# Altium footprint library bitfury.PcbLib: 41 footprints (part 3 of 3)
Each footprint in its own frame and in the unit in brackets; x right, y up, seen from the top. Pads: shape width x height; smd on the part's side, far side on the other; paste and mask are expansions set on the pad; w line width, h text height; cw(c..) or ccw(c..) is an arc to the next point about the centre after c.
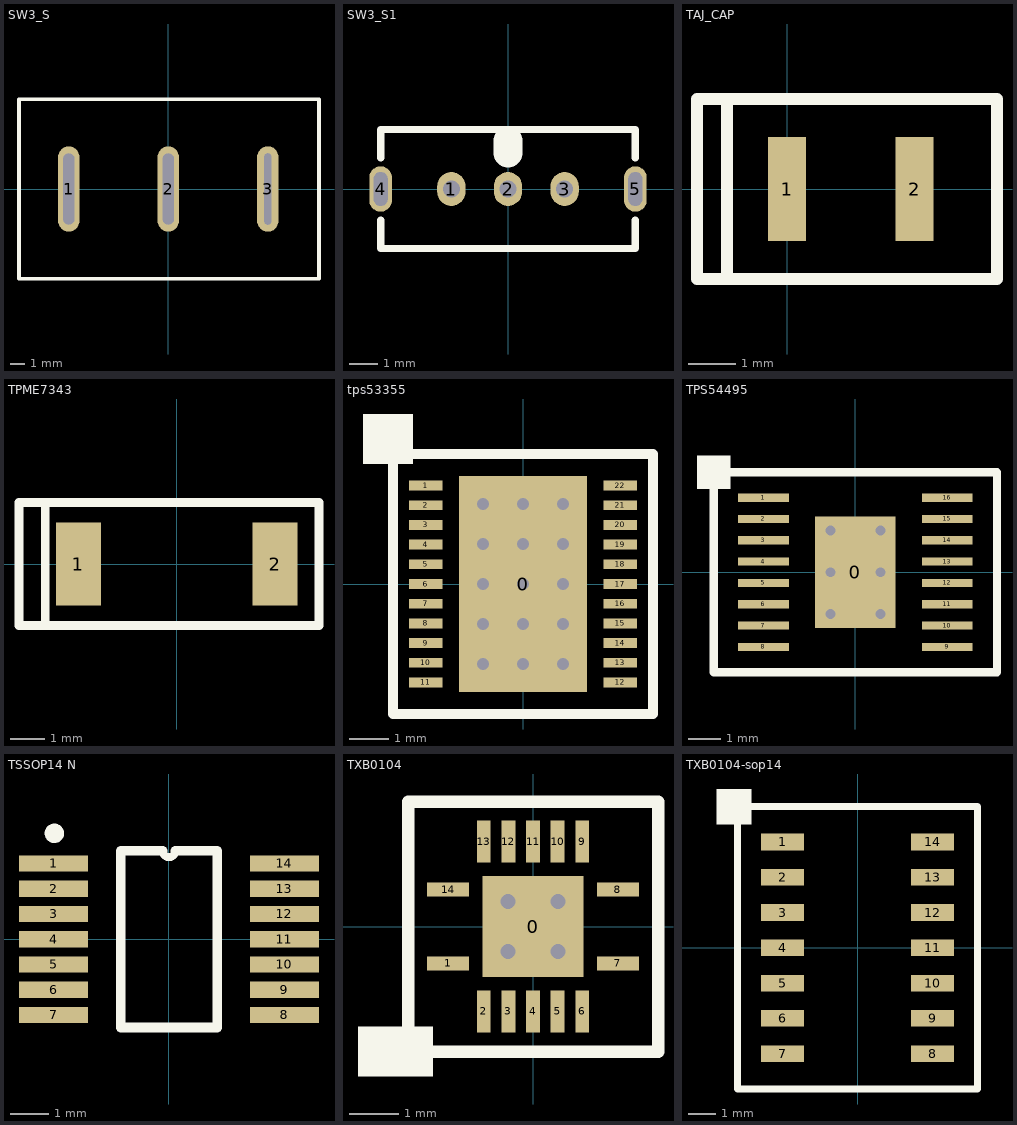
[diagram p2: the footprints below, top view; thin cyan lines are the x and y axes]

## SW3_S [mm]
pads (3):
  oval 1.5x6 hole 0.8 slot 5 at 90 deg: 1(-7,0) 2(0,0)
  oval 1.5x6 hole 0.5 slot 5 at 90 deg: 3(7,0)
Top Overlay:
  lines w0.254: -10.5,-6.3 10.6,-6.3 10.6,6.3 -10.5,6.3 -10.5,-6.3
3D body: height 13.8, standoff 0.1, extent -10.706,-6.5 10.8,6.5

## SW3_S1 [mm]
pads (5):
  oval 1x1.2 hole 0.6: 1(-2,0) 2(0,0) 3(2,0)
  oval 0.8x1.6 hole 0.5 slot 1.2 at 90 deg: 4(-4.5,0) 5(4.5,0)
Top Overlay:
  lines w0.254: -4.496,-1.092 -4.496,-2.1 4.496,-2.1 4.496,-1.092 ; -4.496,1.092 -4.496,2.1 4.496,2.1 4.496,1.092
  lines w1.016: 0,1.27 0,1.702

## TAJ_CAP [mm]
pads (2):
  rect 0.8x2.2 smd: 1(0,0) 2(2.7,0)
Top Overlay:
  lines w0.254: -1.27,-1.905 -1.27,1.905 -1.905,1.905 ; -1.905,1.905 4.445,1.905 4.445,-1.905 -1.905,-1.905 -1.905,1.905

## TPME7343 [mm]
pads (2):
  rect 1.3x2.4 smd: 1(-2.85,0) 2(2.85,0)
Top Overlay:
  lines w0.254: -3.81,-1.778 -3.81,1.778 -4.12,1.778 ; -4.12,1.778 4.12,1.778 4.12,-1.778 -4.572,-1.778 -4.572,1.778 -4.12,1.778

## tps53355 [mm]
pads (23):
  rect 3.24x5.48 smd: 0(0,0)
  rect 0.85x0.25 smd: 1(-2.475,2.5) 2(-2.475,2) 3(-2.475,1.5) 4(-2.475,1) 5(-2.475,0.5) 6(-2.475,0) 7(-2.475,-0.5) 8(-2.475,-1) 9(-2.475,-1.5) 10(-2.475,-2) 11(-2.475,-2.5) 12(2.475,-2.5) 13(2.475,-2) 14(2.475,-1.5) 15(2.475,-1) 16(2.475,-0.5) 17(2.475,0) 18(2.475,0.5) 19(2.475,1) 20(2.475,1.5) 21(2.475,2) 22(2.475,2.5)
via -1.016,2.032 diameter 0.6 hole 0.3
via 0,2.032 diameter 0.6 hole 0.3
via 1.016,2.032 diameter 0.6 hole 0.3
via -1.016,1.016 diameter 0.6 hole 0.3
via 0,1.016 diameter 0.6 hole 0.3
via 1.016,1.016 diameter 0.6 hole 0.3
via -1.016,0 diameter 0.6 hole 0.3
via 0,0 diameter 0.6 hole 0.3
via 1.016,0 diameter 0.6 hole 0.3
via -1.016,-1.016 diameter 0.6 hole 0.3
via 0,-1.016 diameter 0.6 hole 0.3
via 1.016,-1.016 diameter 0.6 hole 0.3
via -1.016,-2.032 diameter 0.6 hole 0.3
via 0,-2.032 diameter 0.6 hole 0.3
via 1.016,-2.032 diameter 0.6 hole 0.3
Top Overlay:
  rectangle: -4.064,3.048 -2.794,4.318
  lines w0.254: -3.302,-3.302 3.302,-3.302 3.302,3.302 -3.048,3.302 -3.302,3.302 -3.302,-3.302

## TPS54495 [mm]
pads (17):
  rect 2.46x3.4 smd: 0(0,0)
  rect 1.55x0.25 smd: 1(-2.8,2.275) 2(-2.8,1.625) 3(-2.8,0.975) 4(-2.8,0.325) 5(-2.8,-0.325) 6(-2.8,-0.975) 7(-2.8,-1.625) 8(-2.8,-2.275) 9(2.8,-2.275) 10(2.8,-1.625) 11(2.8,-0.975) 12(2.8,-0.325) 13(2.8,0.325) 14(2.8,0.975) 15(2.8,1.625) 16(2.8,2.275)
via 0.762,1.27 diameter 0.6 hole 0.3
via 0.762,0 diameter 0.6 hole 0.3
via 0.762,-1.27 diameter 0.6 hole 0.3
via -0.762,-1.27 diameter 0.6 hole 0.3
via -0.762,0 diameter 0.6 hole 0.3
via -0.762,1.27 diameter 0.6 hole 0.3
Top Overlay:
  rectangle: -4.826,2.54 -3.81,3.556
  lines w0.254: -4.318,-3.048 4.318,-3.048 4.318,3.048 -4.318,3.048 -4.318,-3.048

## TSSOP14 N [mm]
pads (14):
  rect 1.78x0.42 smd: 1(-2.97,1.95) 2(-2.97,1.3) 3(-2.97,0.65) 4(-2.97,0) 5(-2.97,-0.65) 6(-2.97,-1.3) 7(-2.97,-1.95) 8(2.97,-1.95) 9(2.97,-1.3) 10(2.97,-0.65) 11(2.97,0) 12(2.97,0.65) 13(2.97,1.3) 14(2.97,1.95)
Top Overlay:
  circle w0.25: c-2.95,2.725 r0.125
  lines w0.2: -0.162,2.275 ccw(c0,2.275) 0.162,2.275
  lines w0.25: -0.162,2.275 -1.245,2.275 -1.245,-2.275 1.245,-2.275 1.245,2.275 0.162,2.275

## TXB0104 [mm]
pads (15):
  rect 2.05x2.05 smd: 0(0,0)
  rect 0.85x0.28 smd: 1(-1.725,-0.75) 7(1.725,-0.75) 8(1.725,0.75) 14(-1.725,0.75)
  rect 0.28x0.85 smd: 2(-1,-1.725) 3(-0.5,-1.725) 4(0,-1.725) 5(0.5,-1.725) 6(1,-1.725) 9(1,1.725) 10(0.5,1.725) 11(0,1.725) 12(-0.5,1.725) 13(-1,1.725)
via 0.508,-0.508 diameter 0.6 hole 0.3
via -0.508,-0.508 diameter 0.6 hole 0.3
via 0.508,0.508 diameter 0.6 hole 0.3
via -0.508,0.508 diameter 0.6 hole 0.3
Top Overlay:
  rectangle: -3.556,-3.048 -2.032,-2.032
  lines w0.254: -2.54,-2.54 -2.54,2.54 2.54,2.54 2.54,-2.54 -2.54,-2.54

## TXB0104-sop14 [mm]
pads (14):
  rect 1.55x0.6 smd: 1(-2.7,3.81) 2(-2.7,2.54) 3(-2.7,1.27) 4(-2.7,0) 5(-2.7,-1.27) 6(-2.7,-2.54) 7(-2.7,-3.81) 8(2.7,-3.81) 9(2.7,-2.54) 10(2.7,-1.27) 11(2.7,0) 12(2.7,1.27) 13(2.7,2.54) 14(2.7,3.81)
Top Overlay:
  rectangle: -5.08,4.445 -3.81,5.715
  lines w0.254: -4.318,-5.08 4.318,-5.08 4.318,5.08 -4.318,5.08 -4.318,-5.08